# Altium footprint library pcb.PcbLib: 397 footprints (part 20 of 25)
Each footprint in its own frame and in the unit in brackets; x right, y up, seen from the top. Pads: shape width x height; smd on the part's side, far side on the other; paste and mask are expansions set on the pad; w line width, h text height; cw(c..) or ccw(c..) is an arc to the next point about the centre after c.
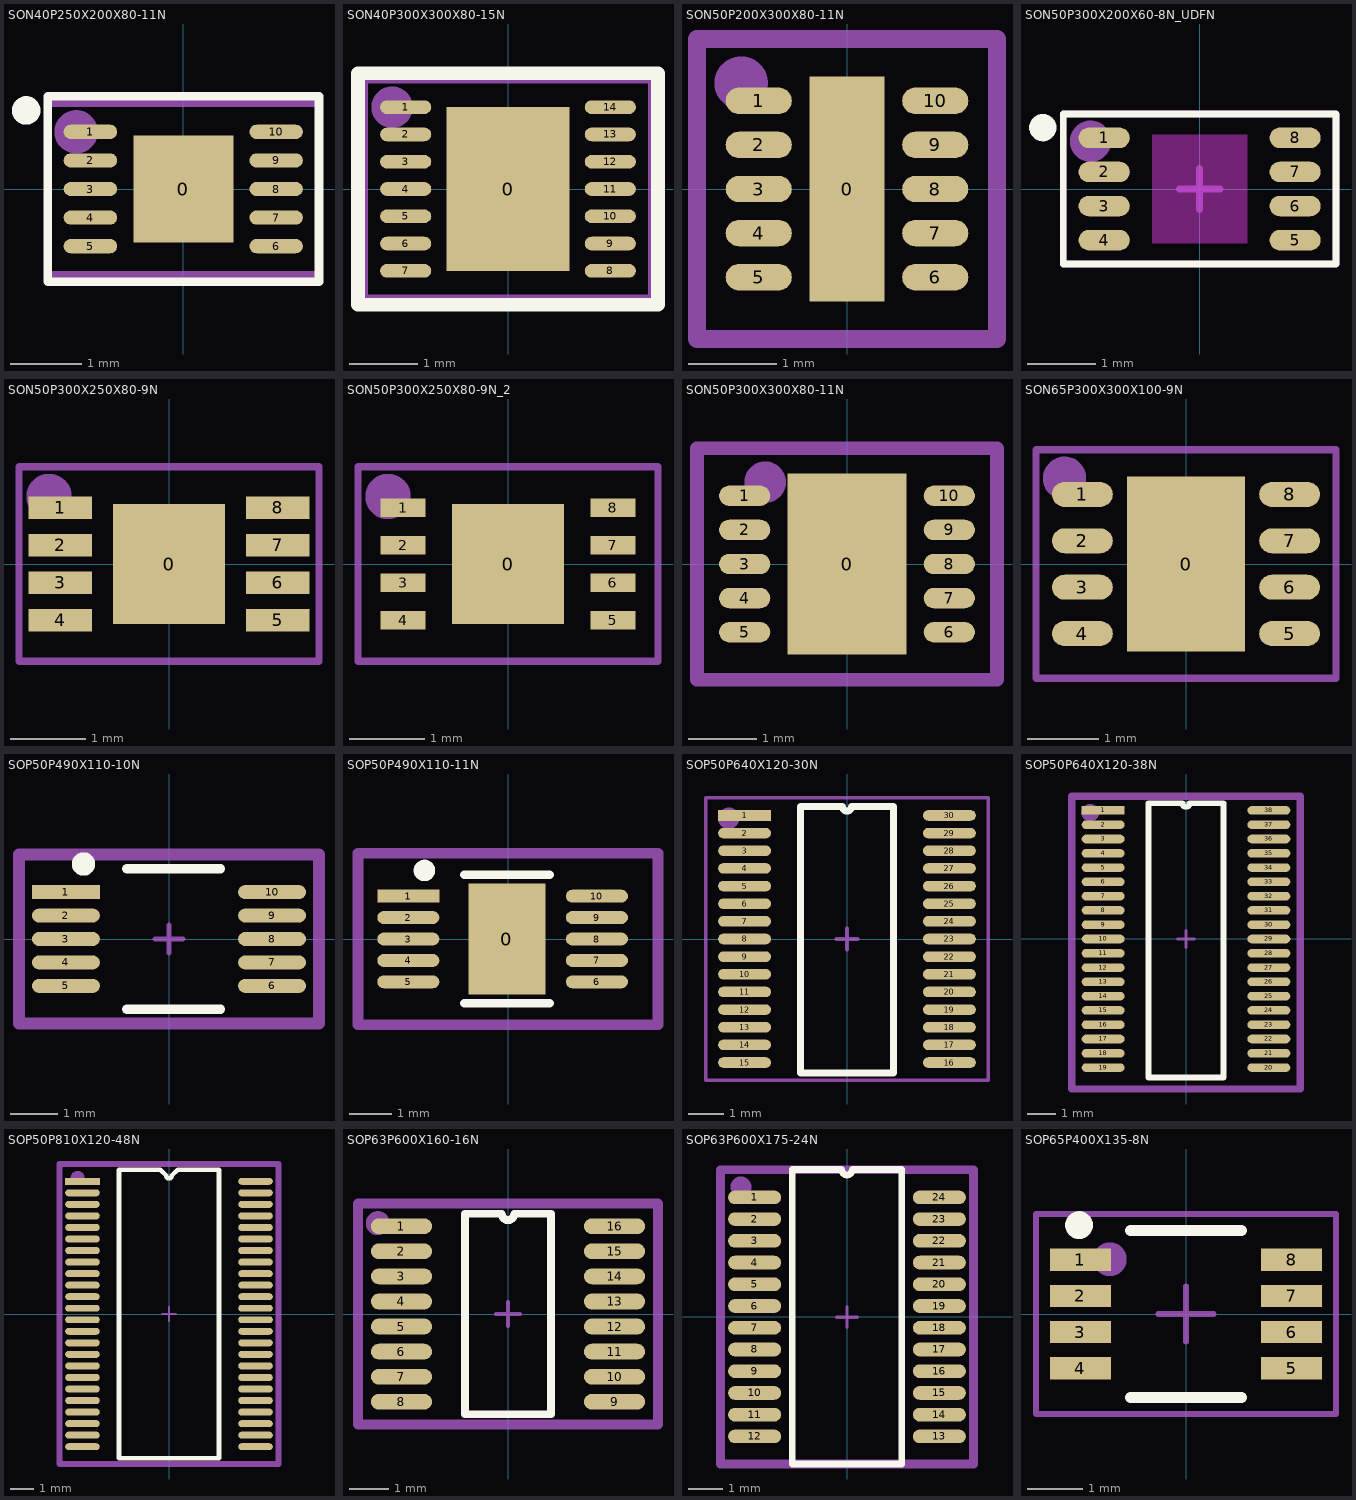
[diagram p19: the footprints below, top view; thin cyan lines are the x and y axes]

## SON40P250X200X80-11N [mm] "SON,0.40mm,pitch;14 pin,2.50mm W X 2.00mm L X 0.80mm H body (w/thermal tab)"
height 0.8
pads (11):
  rect 1.4x1.5 smd paste-5: 0(0,0)
  oval 0.75x0.2 smd paste-0.03: 1(-1.3,0.8) 2(-1.3,0.4) 3(-1.3,0) 4(-1.3,-0.4) 5(-1.3,-0.8) 6(1.3,-0.8) 7(1.3,-0.4) 8(1.3,0) 9(1.3,0.4) 10(1.3,0.8)
Top Overlay:
  circle w0.2: c-2.2,1.1 r0.1
  lines w0.12: -1.9,-1.3 1.9,-1.3 1.9,1.3 -1.9,1.3 -1.9,-1.3
Top Paste:
  region: 0.6,0.65 0.1,0.65 0.1,0.05 0.6,0.05
  rectangle: -0.6,-0.65 -0.1,-0.05
  region: 0.6,-0.05 0.1,-0.05 0.1,-0.65 0.6,-0.65
  rectangle: -0.6,0.05 -0.1,0.65
Mechanical 15:
  circle w0.406: c-1.5,0.8 r0.1
  lines w0.1: -0.3,0 0.3,0 ; 0,-0.3 0,0.3 ; -1.9,-1.2 1.9,-1.2 1.9,1.2 -1.9,1.2 -1.9,-1.2
  text ".Designator" at -1.8,-1.3 h0.8
3D body: height 0.8, standoff 0, extent -1.3,-1.1 1.3,1.1

## SON40P300X300X80-15N [mm] "SON,0.40mm,pitch;14 pin,3.00mm W X 3.00mm L X 0.80mm H body (w/thermal tab)"
pads (15):
  rect 1.8x2.4 smd: 0(0,0)
  oval 0.75x0.2 smd: 1(-1.5,1.2) 2(-1.5,0.8) 3(-1.5,0.4) 4(-1.5,0) 5(-1.5,-0.4) 6(-1.5,-0.8) 7(-1.5,-1.2) 8(1.5,-1.2) 9(1.5,-0.8) 10(1.5,-0.4) 11(1.5,0) 12(1.5,0.4) 13(1.5,0.8) 14(1.5,1.2)
Top Overlay:
  lines w0.2: -2.2,-1.7 -2.2,1.7 2.2,1.7 2.2,-1.7 -2.2,-1.7
Mechanical 15:
  circle w0.406: c-1.7,1.2 r0.1
  lines w0.1: -0.3,0 0.3,0 ; 0,-0.3 0,0.3 ; -2.1,-1.6 -2.1,1.6 2.1,1.6 2.1,-1.6 -2.1,-1.6
  text ".Designator" at -1.8,-1.3 h0.8
3D body: height 1.75, standoff 0, extent -1.6,-1.6 1.6,1.6

## SON50P200X300X80-11N [mm] "SON,0.50mm,pitch;10 pin,2.00mm W X 3.00mm L X 0.80mm H body (w/thermal tab)"
height 0.8
pads (11):
  rect 0.85x2.55 smd: 0(0,0)
  oval 0.75x0.3 smd: 1(-1,1) 2(-1,0.5) 3(-1,0) 4(-1,-0.5) 5(-1,-1) 6(1,-1) 7(1,-0.5) 8(1,0) 9(1,0.5) 10(1,1)
Mechanical 15:
  circle w0.406: c-1.2,1.2 r0.1
  lines w0.1: -0.3,0 0.3,0 ; 0,-0.3 0,0.3
  lines w0.2: -1.7,-1.7 -1.7,1.7 1.7,1.7 1.7,-1.7 -1.7,-1.7
  text ".Designator" at -1.4,-1.4 h1.02
3D body: height 0.85, standoff 0, extent -1,-1.5 1,1.5

## SON50P300X200X60-8N_UDFN [mm]
height 0.6
pads (8):
  oval 0.75x0.3 smd: 1(-1.4,0.75) 2(-1.4,0.25) 3(-1.4,-0.25) 4(-1.4,-0.75) 5(1.4,-0.75) 6(1.4,-0.25) 7(1.4,0.25) 8(1.4,0.75)
Top Layer keep-out:
  rectangle: -0.7,-0.8 0.7,0.8
Top Overlay:
  circle w0.2: c-2.3,0.9 r0.1
  lines w0.1: -2,-1.1 2,-1.1 2,1.1 -2,1.1 -2,-1.1
Mechanical 15:
  circle w0.406: c-1.6,0.7 r0.1
  lines w0.1: -0.3,0 0.3,0 ; 0,-0.3 0,0.3 ; -2,-1.1 -2,1.1 2,1.1 2,-1.1 -2,-1.1
  text ".Designator" at -1.8,-0.9 h0.51
3D body: height 0.6, standoff 0, extent -1.5,-1 1.5,1

## SON50P300X250X80-9N [mm]
height 0.8
pads (9):
  rect 1.5x1.6 smd: 0(0,0)
  rect 0.85x0.3 smd: 1(-1.45,0.75) 2(-1.45,0.25) 3(-1.45,-0.25) 4(-1.45,-0.75) 5(1.45,-0.75) 6(1.45,-0.25) 7(1.45,0.25) 8(1.45,0.75)
Mechanical 15:
  circle w0.406: c-1.6,0.9 r0.1
  lines w0.1: -0.5,0 0.5,0 ; 0,-0.5 0,0.5 ; -2,-1.3 2,-1.3 2,1.3 -2,1.3 -2,-1.3
  text ".Designator" at -1.9,-1.1 h0.51
3D body: height 1.3, standoff 0, extent -1.5,-1.25 1.5,1.25

## SON50P300X250X80-9N_2 [mm]
height 0.8
pads (9):
  rect 1.5x1.6 smd: 0(0,0)
  rect 0.6x0.25 smd: 1(-1.4,0.75) 2(-1.4,0.25) 3(-1.4,-0.25) 4(-1.4,-0.75) 5(1.4,-0.75) 6(1.4,-0.25) 7(1.4,0.25) 8(1.4,0.75)
Mechanical 15:
  circle w0.406: c-1.6,0.9 r0.1
  lines w0.1: -0.5,0 0.5,0 ; 0,-0.5 0,0.5 ; -2,-1.3 -2,1.3 2,1.3 2,-1.3 -2,-1.3
  text ".Designator" at -1.9,-1.1 h0.51
3D body: height 1.3, standoff 0, extent -1.5,-1.25 1.5,1.25

## SON50P300X300X80-11N [mm] "SON,0.50mm,pitch;10 pin,3.00mm W X 3.00mm L X 0.80mm H body (w/thermal tab)"
height 0.8
pads (11):
  rect 1.75x2.65 smd paste-100: 0(0,0)
  oval 0.75x0.3 smd: 1(-1.5,1) 2(-1.5,0.5) 3(-1.5,0) 4(-1.5,-0.5) 5(-1.5,-1) 6(1.5,-1) 7(1.5,-0.5) 8(1.5,0) 9(1.5,0.5) 10(1.5,1)
Top Paste:
  rectangle: -0.7,0.1 -0.1,1.2
  region: 0.7,1.2 0.1,1.2 0.1,0.1 0.7,0.1
  rectangle: -0.7,-1.2 -0.1,-0.1
  region: 0.7,-0.1 0.1,-0.1 0.1,-1.2 0.7,-1.2
Mechanical 15:
  circle w0.406: c-1.2,1.2 r0.1
  lines w0.1: -0.3,0 0.3,0 ; 0,-0.3 0,0.3
  lines w0.2: -2.2,-1.7 2.2,-1.7 2.2,1.7 -2.2,1.7 -2.2,-1.7
  text ".Designator" at -1.4,-1.4 h1.02
3D body: height 0.85, standoff 0, extent -1.5,-1.5 1.5,1.5

## SON65P300X300X100-9N [mm]
height 1
pads (9):
  rect 1.65x2.45 smd: 0(0,0)
  oval 0.85x0.35 smd: 1(-1.45,0.975) 2(-1.45,0.325) 3(-1.45,-0.325) 4(-1.45,-0.975) 5(1.45,-0.975) 6(1.45,-0.325) 7(1.45,0.325) 8(1.45,0.975)
Mechanical 15:
  circle w0.406: c-1.7,1.2 r0.1
  lines w0.1: -0.5,0 0.5,0 ; 0,-0.5 0,0.5 ; -2.1,-1.6 -2.1,1.6 2.1,1.6 2.1,-1.6 -2.1,-1.6
  text ".Designator" at -1.7,-1.2 h0.51
3D body: height 1.3, standoff 0, extent -1.5,-1.5 1.5,1.5

## SOP50P490X110-10N [mm]
pads (10):
  rect 1.45x0.3 smd: 1(-2.2,1)
  oval 1.45x0.3 smd: 2(-2.2,0.5) 3(-2.2,0) 4(-2.2,-0.5) 5(-2.2,-1) 6(2.2,-1) 7(2.2,-0.5) 8(2.2,0) 9(2.2,0.5) 10(2.2,1)
Top Overlay:
  circle w0.25: c-1.825,1.6 r0.125
  lines w0.2: -0.9,-1.5 1.1,-1.5 ; -0.9,1.5 1.1,1.5
Mechanical 15:
  lines w0.1: -0.3,0 0.3,0 ; 0,-0.3 0,0.3
  lines w0.254: -3.2,-1.8 3.2,-1.8 3.2,1.8 -3.2,1.8 -3.2,-1.8
  text ".Designator" at -3,-1.5 h1.02
3D body: height 1, standoff 0, extent -1.5,-1.5 1.5,1.5

## SOP50P490X110-11N [mm] "MSE MSOP 10 LEAD"
pads (11):
  rect 1.8x2.6 smd: 0(-0.025,0)
  rect 1.45x0.3 smd: 1(-2.325,1)
  oval 1.45x0.3 smd: 2(-2.325,0.5) 3(-2.325,0) 4(-2.325,-0.5) 5(-2.325,-1) 6(2.075,-1) 7(2.075,-0.5) 8(2.075,0) 9(2.075,0.5) 10(2.075,1)
Top Overlay:
  circle w0.25: c-1.95,1.6 r0.125
  lines w0.2: -1.025,-1.5 0.975,-1.5 ; -1.025,1.5 0.975,1.5
Mechanical 15:
  lines w0.1: -0.425,0 0.175,0 ; -0.125,-0.3 -0.125,0.3
  lines w0.254: -3.5,-2 3.5,-2 3.5,2 -3.5,2 -3.5,-2
  text ".Designator" at -3.125,-1.5 h1.02
3D body: height 1, standoff 0, extent -1.625,-1.5 1.375,1.5

## SOP50P640X120-30N [mm]
height 1.2
pads (30):
  rect 1.5x0.3 smd: 1(-2.9,3.5)
  oval 1.5x0.3 smd: 2(-2.9,3) 3(-2.9,2.5) 4(-2.9,2) 5(-2.9,1.5) 6(-2.9,1) 7(-2.9,0.5) 8(-2.9,0) 9(-2.9,-0.5) 10(-2.9,-1) 11(-2.9,-1.5) 12(-2.9,-2) 13(-2.9,-2.5) 14(-2.9,-3) 15(-2.9,-3.5) 16(2.9,-3.5) 17(2.9,-3) 18(2.9,-2.5) 19(2.9,-2) 20(2.9,-1.5) 21(2.9,-1) 22(2.9,-0.5) 23(2.9,0) 24(2.9,0.5) 25(2.9,1) 26(2.9,1.5) 27(2.9,2) 28(2.9,2.5) 29(2.9,3) 30(2.9,3.5)
Top Overlay:
  lines w0.2: -1.315,-3.8 1.315,-3.8 1.315,3.75 0.125,3.75 cw(c0,3.75) -0.125,3.75 -1.315,3.75 -1.315,-3.8
Mechanical 15:
  circle w0.406: c-3.351,3.42 r0.1
  lines w0.1: -0.3,0 0.3,0 ; 0,-0.3 0,0.3 ; -4,-4 4,-4 4,4 -4,4 -4,-4
  text ".Designator" at -2.8,2.3 h1.02
3D body: height 1, standoff 0, extent -2.3,-3.9 2.3,3.9

## SOP50P640X120-38N [mm]
height 2.38
pads (38):
  rect 1.5x0.3 smd: 1(-2.9,4.5)
  oval 1.5x0.3 smd: 2(-2.9,4) 3(-2.9,3.5) 4(-2.9,3) 5(-2.9,2.5) 6(-2.9,2) 7(-2.9,1.5) 8(-2.9,1) 9(-2.9,0.5) 10(-2.9,0) 11(-2.9,-0.5) 12(-2.9,-1) 13(-2.9,-1.5) 14(-2.9,-2) 15(-2.9,-2.5) 16(-2.9,-3) 17(-2.9,-3.5) 18(-2.9,-4) 19(-2.9,-4.5) 20(2.9,-4.5) 21(2.9,-4) 22(2.9,-3.5) 23(2.9,-3) 24(2.9,-2.5) 25(2.9,-2) 26(2.9,-1.5) 27(2.9,-1) 28(2.9,-0.5) 29(2.9,0) 30(2.9,0.5) 31(2.9,1) 32(2.9,1.5) 33(2.9,2) 34(2.9,2.5) 35(2.9,3) 36(2.9,3.5) 37(2.9,4) 38(2.9,4.5)
Top Overlay:
  lines w0.2: -1.315,-4.85 -1.315,4.75 -0.125,4.75 ccw(c0,4.75) 0.125,4.75 1.315,4.75 1.315,-4.85 -1.315,-4.85
Mechanical 15:
  circle w0.406: c-3.351,4.42 r0.1
  lines w0.1: -0.3,0 0.3,0 ; 0,-0.3 0,0.3
  lines w0.254: -4,-5.25 -4,5 4,5 4,-5.25 -4,-5.25
  text ".Designator" at -3.75,3.5 h1.02
3D body: height 1, standoff 0, extent -2.3,-4.9 2.3,4.8

## SOP50P810X120-48N [mm]
height 2.38
pads (48):
  rect 1.5x0.3 smd: 1(-3.75,5.75)
  oval 1.5x0.3 smd: 2(-3.75,5.25) 3(-3.75,4.75) 4(-3.75,4.25) 5(-3.75,3.75) 6(-3.75,3.25) 7(-3.75,2.75) 8(-3.75,2.25) 9(-3.75,1.75) 10(-3.75,1.25) 11(-3.75,0.75) 12(-3.75,0.25) 13(-3.75,-0.25) 14(-3.75,-0.75) 15(-3.75,-1.25) 16(-3.75,-1.75) 17(-3.75,-2.25) 18(-3.75,-2.75) 19(-3.75,-3.25) 20(-3.75,-3.75) 21(-3.75,-4.25) 22(-3.75,-4.75) 23(-3.75,-5.25) 24(-3.75,-5.75) 25(3.75,-5.75) 26(3.75,-5.25) 27(3.75,-4.75) 28(3.75,-4.25) 29(3.75,-3.75) 30(3.75,-3.25) 31(3.75,-2.75) 32(3.75,-2.25) 33(3.75,-1.75) 34(3.75,-1.25) 35(3.75,-0.75) 36(3.75,-0.25) 37(3.75,0.25) 38(3.75,0.75) 39(3.75,1.25) 40(3.75,1.75) 41(3.75,2.25) 42(3.75,2.75) 43(3.75,3.25) 44(3.75,3.75) 45(3.75,4.25) 46(3.75,4.75) 47(3.75,5.25) 48(3.75,5.75)
Top Overlay:
  lines w0.2: -2.165,-6.25 2.165,-6.25 2.165,6.25 0.375,6.25 0.125,6 cw(c0,6) -0.125,6 -0.375,6.25 -2.165,6.25 -2.165,-6.25
Mechanical 15:
  circle w0.406: c-3.961,5.893 r0.1
  lines w0.1: -0.3,0 0.3,0 ; 0,-0.3 0,0.3
  lines w0.254: -4.75,-6.5 -4.75,6.5 4.75,6.5 4.75,-6.5 -4.75,-6.5
  text ".Designator" at -1.25,4.75 h1.02
3D body: height 1, standoff 0, extent -3.1,-6.2 3.1,6.3

## SOP63P600X160-16N [mm]
pads (16):
  oval 1.55x0.4 smd: 1(-2.7,2.222) 2(-2.7,1.587) 3(-2.7,0.953) 4(-2.7,0.318) 5(-2.7,-0.318) 6(-2.7,-0.953) 7(-2.7,-1.587) 8(-2.7,-2.222) 9(2.7,-2.222) 10(2.7,-1.587) 11(2.7,-0.953) 12(2.7,-0.318) 13(2.7,0.318) 14(2.7,0.953) 15(2.7,1.587) 16(2.7,2.222)
Top Overlay:
  lines w0.2: -1.09,-2.54 1.09,-2.54 1.09,2.54 0.159,2.54 cw(c0,2.54) -0.159,2.54 -1.09,2.54 -1.09,-2.54
Mechanical 15:
  circle w0.406: c-3.3,2.3 r0.1
  lines w0.1: -0.3,0 0.3,0 ; 0,-0.3 0,0.3
  lines w0.254: -3.8,-2.8 3.8,-2.8 3.8,2.8 -3.8,2.8 -3.8,-2.8
  text ".Designator" at -3.4,-2.4 h1.02
3D body: height 1, standoff 0, extent -2,-2.5 2,2.5

## SOP63P600X175-24N [mm] "SOP,0.635mm,pitch;24 pin,3.90mm W X 8.65mm L X 1.75mm H body"
pads (24):
  oval 1.55x0.4 smd: 1(-2.7,3.492) 2(-2.7,2.857) 3(-2.7,2.222) 4(-2.7,1.587) 5(-2.7,0.953) 6(-2.7,0.318) 7(-2.7,-0.318) 8(-2.7,-0.953) 9(-2.7,-1.587) 10(-2.7,-2.222) 11(-2.7,-2.857) 12(-2.7,-3.492) 13(2.7,-3.492) 14(2.7,-2.857) 15(2.7,-2.222) 16(2.7,-1.587) 17(2.7,-0.953) 18(2.7,-0.318) 19(2.7,0.318) 20(2.7,0.953) 21(2.7,1.587) 22(2.7,2.222) 23(2.7,2.857) 24(2.7,3.492)
Top Overlay:
  lines w0.2: -1.6,-4.3 1.6,-4.3 1.6,4.31 0.159,4.31 cw(c0,4.31) -0.159,4.31 -1.6,4.31 -1.6,-4.3
Mechanical 15:
  circle w0.406: c-3.1,3.8 r0.1
  lines w0.1: -0.3,-0.008 0.3,-0.008 ; 0,-0.308 0,0.292
  lines w0.254: -3.7,-4.3 -3.7,4.3 3.7,4.3 3.7,-4.3 -3.7,-4.3
  text ".Designator" at -2.8,2.4 h1.02
3D body: height 1, standoff 0, extent -2,-4.3 2,4.3

## SOP65P400X135-8N [mm]
height 1.3
pads (8):
  rect 1.1x0.4 smd: 1(-1.9,0.975) 2(-1.9,0.325) 3(-1.9,-0.325) 4(-1.9,-0.975) 5(1.9,-0.975) 6(1.9,-0.325) 7(1.9,0.325) 8(1.9,0.975)
Top Overlay:
  circle w0.25: c-1.925,1.6 r0.125
  lines w0.2: -1,-1.5 1,-1.5 ; -1,1.5 1,1.5
Mechanical 15:
  circle w0.406: c-1.37,0.985 r0.1
  lines w0.1: -0.5,0 0.5,0 ; 0,-0.5 0,0.5 ; -2.7,-1.8 2.7,-1.8 2.7,1.8 -2.7,1.8 -2.7,-1.8
  text ".Designator" at -2.5,-1.2 h0.51
3D body: height 1.3, standoff 0, extent -1.4,-1.5 1.4,1.525